# Altium footprint library PCB_MPPT.PcbLib: 48 footprints (part 1 of 3)
Each footprint in its own frame and in the unit in brackets; x right, y up, seen from the top. Pads: shape width x height; smd on the part's side, far side on the other; paste and mask are expansions set on the pad; w line width, h text height; cw(c..) or ccw(c..) is an arc to the next point about the centre after c.
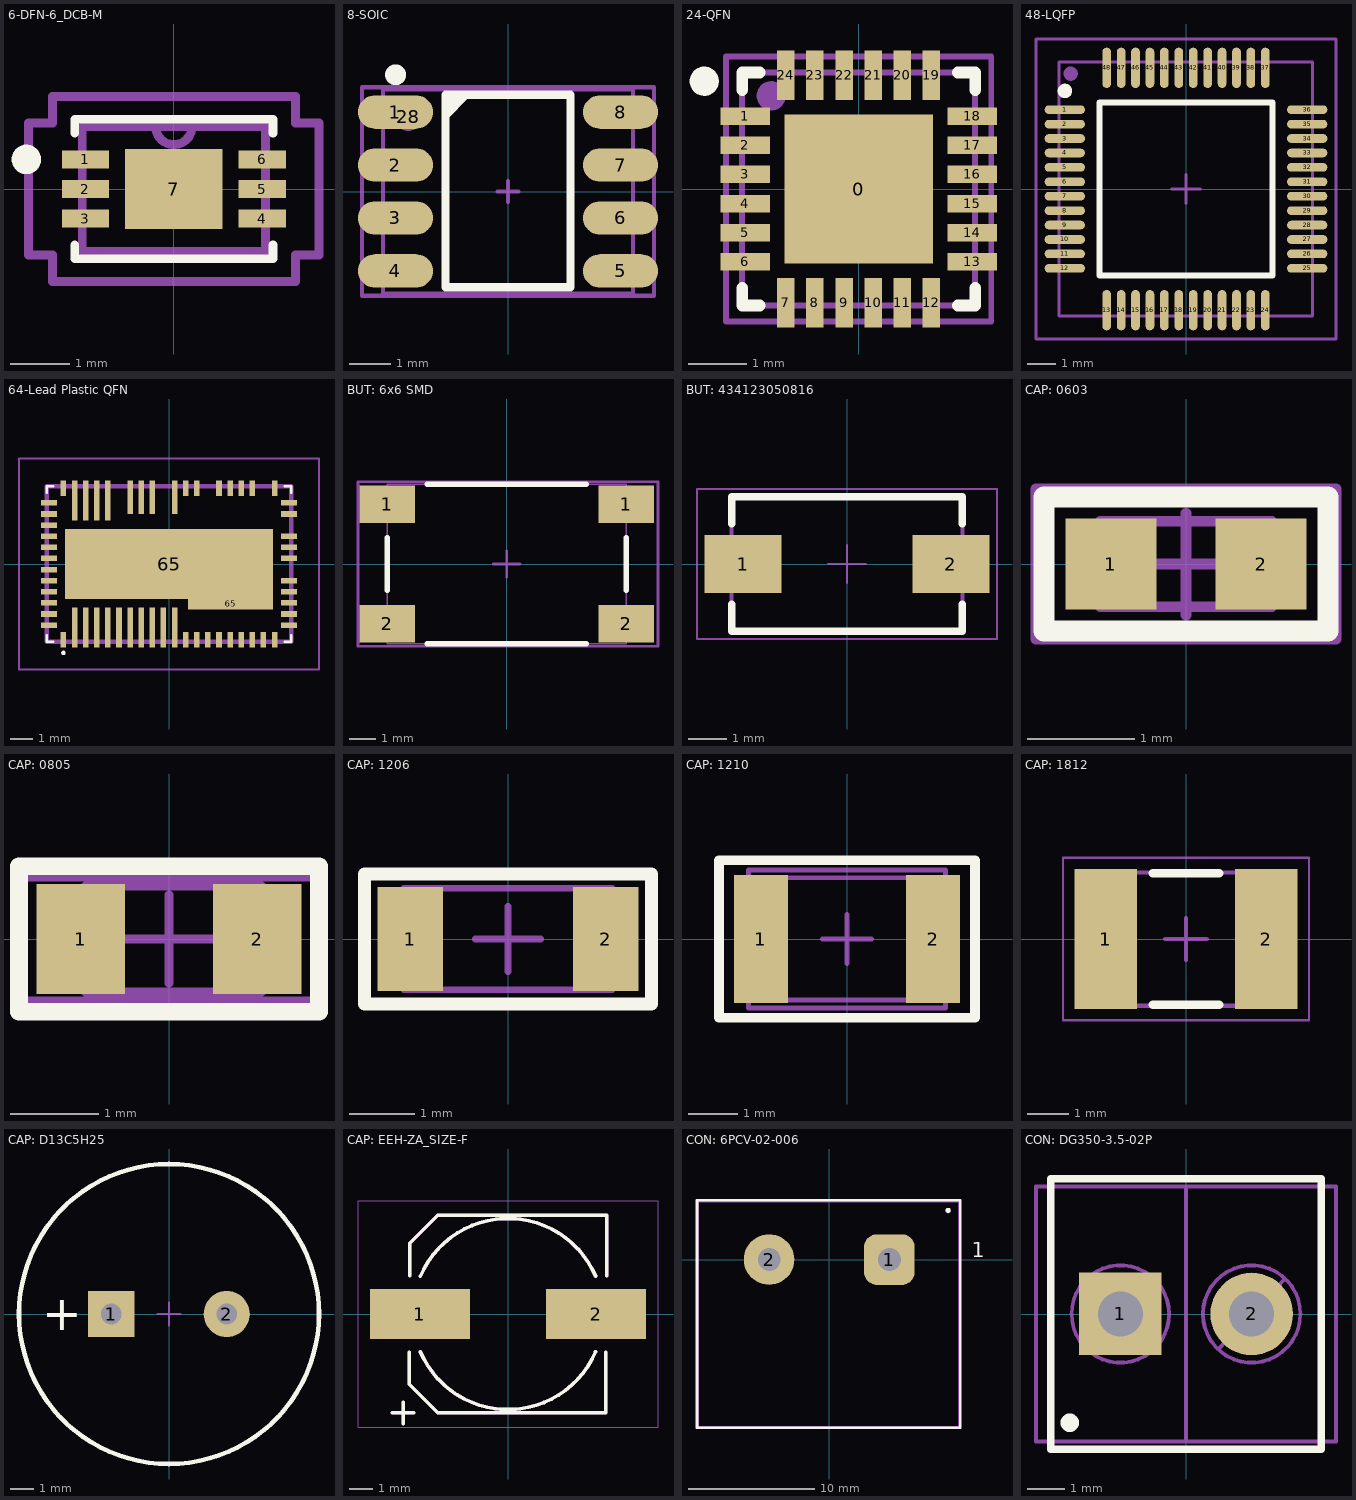
[diagram p0: the footprints below, top view; thin cyan lines are the x and y axes]

## 6-DFN-6_DCB-M [mm]
pads (7):
  rect 0.8x0.3 smd paste+0 mask+0.102: 1(-1.495,0.5)
  rect 0.8x0.3 smd paste+0: 2(-1.495,0) 3(-1.495,-0.5) 4(1.495,-0.5) 5(1.495,0) 6(1.495,0.5)
  rect 1.65x1.35 smd paste-0.864: 7(0,0)
Top Overlay:
  circle w0.25: c-2.495,0.5 r0.125
  lines w0.15: -1.676,-0.945 -1.676,-1.181 1.676,-1.181 1.676,-0.945 ; -1.676,0.945 -1.676,1.181 1.676,1.181 1.676,0.945
Top Paste:
  region: 0.876,0.724 -0.876,0.724 -0.876,-0.724 0.876,-0.724
Top Assy:
  lines w0.15: -0.305,1.054 ccw(c0,1.054) 0.305,1.054 ; -1.549,-1.054 1.549,-1.054 1.549,1.054 -1.549,1.054 -1.549,-1.054
Mechanical 15:
  lines w0.152: -2.457,-1.12 -2.457,1.12 -2.057,1.12 -2.057,1.562 2.057,1.562 2.057,1.12 2.457,1.12 2.457,-1.12 2.057,-1.12 2.057,-1.562 -2.057,-1.562 -2.057,-1.12 -2.457,-1.12
3D body: height 0.25, standoff 0, extent 0,0 0.254,0.254
3D body "DFN-6_DCB-M.step": height 0.81, standoff 0, extent -1.549,-1.054 1.549,1.054

## 8-SOIC [mm] "pitch 1.27 mm"
pads (9):
  rrect100% 1.8x0.8 smd: 1(-2.7,1.905) 2(-2.7,0.635) 3(-2.7,-0.635) 4(-2.7,-1.905) 5(2.7,-1.905) 6(2.7,-0.635) 7(2.7,0.635) 8(2.7,1.905)
  round 0.7 on Mech1: 28(-2.395,1.8)
Top Overlay:
  circle w0.25: c-2.7,2.8 r0.125
  region: -1.56,2.36 -1.56,1.64 -0.84,2.36
  lines w0.2: -1.5,-2.3 1.5,-2.3 1.5,2.325 -1.5,2.325 -1.5,-2.3
Top Assy:
  lines w0.1: -3,-2.45 -3,2.45 3,2.45 3,-2.45 -3,-2.45
Mechanical 15:
  lines w0.1: -0.25,0 0.25,0 ; 0,-0.25 0,0.25 ; -3.5,-2.5 -3.5,2.5 3.5,2.5 3.5,-2.5 -3.5,-2.5
3D body "User Library-SOIC-8-1.STEP": height 1.75, standoff 0, extent -3,-2.45 3,2.45

## 24-QFN [mm] "4x4 mm, pitch 0.5 mm, power pad"
height 0.75
pads (25):
  rect 2.55x2.55 smd: 0(0,0)
  rect 0.85x0.3 smd: 1(-1.95,1.25) 2(-1.95,0.75) 3(-1.95,0.25) 4(-1.95,-0.25) 5(-1.95,-0.75) 6(-1.95,-1.25) 13(1.95,-1.25) 14(1.95,-0.75) 15(1.95,-0.25) 16(1.95,0.25) 17(1.95,0.75) 18(1.95,1.25)
  rect 0.3x0.85 smd: 7(-1.25,-1.95) 8(-0.75,-1.95) 9(-0.25,-1.95) 10(0.25,-1.95) 11(0.75,-1.95) 12(1.25,-1.95) 19(1.25,1.95) 20(0.75,1.95) 21(0.25,1.95) 22(-0.25,1.95) 23(-0.75,1.95) 24(-1.25,1.95)
Top Overlay:
  circle w0.25: c-2.65,1.85 r0.125
  lines w0.2: -2,-1.7 -2,-2 -1.7,-2 ; -2,1.7 -2,2 -1.7,2 ; 1.7,-2 2,-2 2,-1.7 ; 1.7,2 2,2 2,1.7
Top Assy:
  circle w0.25: c-1.5,1.6 r0.125
  lines w0.1: -2,-2 -2,2 2,2 2,-2 -2,-2
Mechanical 15:
  lines w0.1: -0.5,0 0.5,0 ; 0,-0.5 0,0.5 ; -2.275,-2.275 -2.275,2.275 2.275,2.275 2.275,-2.275 -2.275,-2.275
3D body "24-QFN (4x4 mm).step": height 0.75, standoff 0, extent -2,-2 2,2

## 48-LQFP [mm] "QFP, 48-Leads, Body 7x7mm, Pitch 0.5mm, IPC Medium Density"
height 1.6
pads (49):
  oval 1.4x0.3 smd: 1(-4.2,2.75) 2(-4.2,2.25) 3(-4.2,1.75) 4(-4.2,1.25) 5(-4.2,0.75) 6(-4.2,0.25) 7(-4.2,-0.25) 8(-4.2,-0.75) 9(-4.2,-1.25) 10(-4.2,-1.75) 11(-4.2,-2.25) 12(-4.2,-2.75) 25(4.2,-2.75) 26(4.2,-2.25) 27(4.2,-1.75) 28(4.2,-1.25) 29(4.2,-0.75) 30(4.2,-0.25) 31(4.2,0.25) 32(4.2,0.75) 33(4.2,1.25) 34(4.2,1.75) 35(4.2,2.25) 36(4.2,2.75)
  oval 0.3x1.4 smd: 13(-2.75,-4.2) 14(-2.25,-4.2) 15(-1.75,-4.2) 16(-1.25,-4.2) 17(-0.75,-4.2) 18(-0.25,-4.2) 19(0.25,-4.2) 20(0.75,-4.2) 21(1.25,-4.2) 22(1.75,-4.2) 23(2.25,-4.2) 24(2.75,-4.2) 37(2.75,4.2) 38(2.25,4.2) 39(1.75,4.2) 40(1.25,4.2) 41(0.75,4.2) 42(0.25,4.2) 43(-0.25,4.2) 44(-0.75,4.2) 45(-1.25,4.2) 46(-1.75,4.2) 47(-2.25,4.2) 48(-2.75,4.2)
  round 0.5 on Mech1: ""(-4,4)
Top Overlay:
  circle w0.25: c-4.2,3.4 r0.125
  lines w0.2: -3,-3 -3,3 3,3 3,-3 -3,-3
Top Assy:
  lines w0.1: -4.4,-4.4 -4.4,4.4 4.386,4.4 4.386,-4.4 -4.4,-4.4
Mechanical 15:
  lines w0.1: -0.5,0 0.5,0 ; 0,-0.5 0,0.5 ; -5.2,-5.2 -5.2,5.2 5.2,5.2 5.2,-5.2 -5.2,-5.2
3D body "User Library-LQFP48-0_5.STEP": height 1.55, standoff -0.02, extent -4.386,-4.386 4.386,4.386

## 64-Lead Plastic QFN [mm] "64-Lead (7mm ? 11mm) Plastic QFN"
pads (60):
  rect 0.25x0.7 smd: 1(-4.75,-3.4) 12(0.75,-3.4) 13(1.25,-3.4) 14(1.75,-3.4) 15(2.25,-3.4) 16(2.75,-3.4) 17(3.25,-3.4) 18(3.75,-3.4) 19(4.25,-3.4) 20(4.75,-3.4) 33(4.75,3.4) 35(3.75,3.4) 36(3.25,3.4) 37(2.75,3.4) 38(2.25,3.4) 40(1.25,3.4) 41(0.75,3.4) 52(-4.75,3.4)
  rect 0.25x1.8 smd: 2(-4.25,-2.85) 3(-3.75,-2.85) 4(-3.25,-2.85) 5(-2.75,-2.85) 6(-2.25,-2.85) 7(-1.75,-2.85) 8(-1.25,-2.85) 9(-0.75,-2.85) 10(-0.25,-2.85) 11(0.25,-2.85) 48(-2.75,2.85) 49(-3.25,2.85) 50(-3.75,2.85) 51(-4.25,2.85)
  rect 0.7x0.25 smd: 21(5.4,-2.75) 22(5.4,-2.25) 23(5.4,-1.75) 24(5.4,-1.25) 25(5.4,-0.75) 27(5.4,0.25) 28(5.4,0.75) 29(5.4,1.25) 31(5.4,2.25) 32(5.4,2.75) 53(-5.4,2.75) 54(-5.4,2.25) 55(-5.4,1.75) 56(-5.4,1.25) 57(-5.4,0.75) 58(-5.4,0.25) 59(-5.4,-0.25) 60(-5.4,-0.75) 61(-5.4,-1.25) 62(-5.4,-1.75) 63(-5.4,-2.25) 64(-5.4,-2.75)
  rect 0.25x1.5 smd: 42(0.25,3) 44(-0.75,3) 45(-1.25,3) 46(-1.75,3)
  rect 9.38x3.15 smd: 65(0,0)
  rect 3.83x0.5 smd: 65(2.775,-1.8)
Top Overlay:
  lines w0.1: -5.5,-3.2 -5.5,-3.5 -5.2,-3.5 ; -5.5,3.2 -5.5,3.5 -5.2,3.5 ; 5.2,-3.5 5.5,-3.5 5.5,-3.2 ; 5.2,3.5 5.5,3.5 5.5,3.2 ; -4.8,-4 ccw(c-4.75,-4) -4.7,-4 ccw(c-4.75,-4) -4.8,-4
3DBody:
  lines w0.2: -5.5,-3.5 5.5,-3.5 5.5,3.5 -5.5,3.5 -5.5,-3.5
Mechanical 15:
  lines w0.1: -6.75,-4.75 6.75,-4.75 6.75,4.75 -6.75,4.75 -6.75,-4.75
3D body "LT8490IUKJ#PBF.stp": height 0.9, standoff 0, extent -5.5,-3.5 5.5,3.5

## BUT: 6x6 SMD [mm] "Leaded Tactile Button 6x6"
height 9
pads (4):
  rect 2.1x1.4 smd: 1(-4.5,2.25) 1(4.5,2.25) 2(-4.5,-2.25) 2(4.5,-2.25)
Top Overlay:
  lines w0.2: -4.5,-1 -4.5,1 ; -3,-3 3,-3 ; -3,3 3,3 ; 4.5,-1 4.5,1
Top Assy:
  lines w0.05: -4.5,-3 4.5,-3 4.5,3 -4.5,3 -4.5,-3
Mechanical 15:
  lines w0.1: -0.5,0 0.5,0 ; 0,-0.5 0,0.5 ; -5.6,-3.1 -5.6,3.1 5.7,3.1 5.7,-3.1 -5.6,-3.1
3D body "User Library-PTS645SL43SMTR92-LFS.STEP": height 4.3, standoff 0, extent -4.5,-3 4.5,3

## BUT: 434123050816 [mm] "SMD Tact Switch, body 6x3.5mm"
height 5
pads (2):
  rect 2x1.5 smd: 1(-2.7,0) 2(2.7,0)
Top Overlay:
  lines w0.2: -3,-1.05 -3,-1.75 3,-1.75 3,-1.05 ; -3,1.05 -3,1.75 3,1.75 3,1.05
3DBody:
  lines w0.1: -3,-1.75 -3,1.75 3,1.75 3,-1.75 -3,-1.75
Mechanical 15:
  lines w0.05: -0.5,0 0.5,0 ; 0,-0.5 0,0.5 ; -3.9,-1.95 3.9,-1.95 3.9,1.95 -3.9,1.95 -3.9,-1.95
3D body "4341x30508x6.stp": height 5, standoff 0, extent -3.649,-1.75 3.65,1.75

## CAP: 0603 [mm]
height 0.45
pads (2):
  rect 0.85x0.85 smd: 1(-0.7,0) 2(0.7,0)
Top Overlay:
  lines w0.2: -1.325,-0.625 1.325,-0.625 1.325,0.625 -1.325,0.625 -1.325,-0.625
Top Assy:
  lines w0.1: -0.8,-0.4 0.8,-0.4 0.8,0.4 -0.8,0.4 -0.8,-0.4
Mechanical 15:
  lines w0.1: -0.475,0 0.475,0 ; 0,-0.475 0,0.475 ; -1.4,-0.7 -1.4,0.7 1.4,0.7 1.4,-0.7 -1.4,-0.7
3D body "SW3dPS-0603 SMD Capacitor.STEP": height 0.3, standoff 0, extent -0.8,-0.4 0.8,0.4

## CAP: 0805 [mm]
height 0.45
pads (2):
  rect 1x1.25 smd: 1(-1,0) 2(1,0)
Top Overlay:
  lines w0.2: -1.7,-0.825 -1.7,0.825 1.7,0.825 1.7,-0.825 -1.7,-0.825
Top Assy:
  lines w0.1: -0.949,-0.6 -0.949,0.6 1.05,0.6 1.05,-0.6 -0.949,-0.6
Mechanical 15:
  lines w0.1: -0.5,0 0.5,0 ; 0,-0.5 0,0.5 ; -1.7,-0.7 1.7,-0.7 1.7,0.7 -1.7,0.7 -1.7,-0.7
3D body "SW3dPS-0805 SMD Capacitor.STEP": height 0.78, standoff 0, extent -1,-0.625 1,0.625

## CAP: 1206 [mm]
height 0.6
pads (2):
  rect 1x1.6 smd: 1(-1.5,0) 2(1.5,0)
Top Overlay:
  lines w0.2: -2.2,-1 -2.2,1 2.2,1 2.2,-1 -2.2,-1
Top Assy:
  lines w0.1: -1.6,-0.775 -1.6,0.775 1.6,0.775 1.6,-0.775 -1.6,-0.775
Mechanical 15:
  lines w0.1: -0.5,0 0.5,0 ; 0,-0.5 0,0.5 ; -2.2,-1 2.2,-1 2.2,1 -2.2,1 -2.2,-1
3D body "SW3dPS-1206 SMD Capacitor.STEP": height 1, standoff 0, extent -1.6,-0.8 1.6,0.8

## CAP: 1210 [mm]
height 2.5
pads (2):
  rect 1.1x2.6 smd: 1(-1.75,0) 2(1.75,0)
Top Overlay:
  lines w0.2: -2.6,-1.6 2.6,-1.6 2.6,1.6 -2.6,1.6 -2.6,-1.6
Top Assy:
  lines w0.1: -2,-1.244 -2,1.245 2,1.245 2,-1.244 -2,-1.244
Mechanical 15:
  lines w0.1: -0.5,0 0.5,0 ; 0,-0.5 0,0.5 ; -2,-1.4 2,-1.4 2,1.4 -2,1.4 -2,-1.4
3D body "User Library-1210(3225M) Cap.STEP": height 1.7, standoff 0, extent -2,-1.244 2,1.245

## CAP: 1812 [mm]
height 1.4
pads (2):
  rect 1.5x3.35 smd: 1(-1.925,0) 2(1.925,0)
Top Overlay:
  lines w0.2: -0.8,-1.575 0.8,-1.575 ; -0.8,1.575 0.8,1.575
Top Assy:
  lines w0.1: -2.25,-1.6 -2.25,1.6 2.25,1.6 2.25,-1.6 -2.25,-1.6
Mechanical 15:
  lines w0.05: -2.95,-1.95 -2.95,1.95 2.95,1.95 2.95,-1.95 -2.95,-1.95
  lines w0.1: -0.5,0 0.5,0 ; 0,-0.5 0,0.5
3D body "SW3dPS-1812 SMD Capacitor.STEP": height 1.6, standoff 0, extent -2.25,-1.6 2.25,1.6

## CAP: D13C5H25 [mm]
height 25
pads (2):
  rect 2x2 hole 0.9: 1(-2.5,0)
  round 2 hole 0.9: 2(2.5,0)
Top Overlay:
  circle w0.2: c0,0 r6.5
  text "+" at -5.486,-0.695 h1.5
Top Assy:
  circle w0.1: c0,0 r6.5
Mechanical 15:
  circle w0.1: c0,0 r6.5
  lines w0.1: -0.5,0 0.5,0 ; 0,-0.5 0,0.5
3D body "User Library-Cap-EL(13x25-5).STEP": height 25, standoff -3.3, extent -6.5,-6.499 6.502,6.499

## CAP: EEH-ZA_SIZE-F [mm] "SMD=8.3x8.3; D = 8; H= 10.5 Panasonic Hybrid"
pads (2):
  rect 4.2x2.1 smd: 1(-3.7,0) 2(3.7,0)
Top Overlay:
  lines w0.15: -4.85,-4.15 -3.95,-4.15 ; -4.4,-4.6 -4.4,-3.7 ; -4.15,-1.6 -4.15,-2.95 -2.95,-4.15 4.1,-4.15 4.1,-1.6 ; -4.125,1.6 -4.125,2.975 -2.95,4.15 4.15,4.15 4.15,1.6 ; -3.682,-1.577 ccw(c0,-0.014) 3.676,-1.59 ; -3.677,1.59 cw(c0,0.014) 3.682,1.577
Top Assy:
  lines w0.15: -4.85,-4.15 -3.95,-4.15 ; -4.4,-4.6 -4.4,-3.7 ; -4.15,-1.6 -4.15,-2.95 -2.95,-4.15 4.1,-4.15 4.1,-1.6 ; -4.125,1.6 -4.125,2.975 -2.95,4.15 4.15,4.15 4.15,1.6 ; -3.682,-1.577 ccw(c0,-0.014) 3.676,-1.59 ; -3.677,1.59 cw(c0,0.014) 3.682,1.577
Mechanical 15:
  lines w0.05: -6.3,-4.75 6.3,-4.75 6.3,4.75 -6.3,4.75 -6.3,-4.75
3D body "EEH-ZA1J330P.stp": height 10.5, standoff 0, extent -5,-4.25 5,4.25

## CON: 6PCV-02-006 [mm]
pads (2):
  rrect50% 4x4 hole 1.8: 1(4.75,0)
  round 4 hole 1.8: 2(-4.75,0)
Top Overlay:
  circle w0.2: c9.384,3.893 r0.1
  lines w0.2: -10.45,-13.3 -10.45,4.7 10.35,4.7 10.35,-13.3 -10.45,-13.3
  text "1" at 11.252,-0.203 h2
Top Assy:
  circle w0.2: c9.399,3.856 r0.1
  lines w0.1: -10.35,-13.2 -10.35,4.58 10.25,4.58 10.25,-13.2 -10.35,-13.2
  text "1" at 4.45,-3.6 h2
  text "2" at -4.95,-3.6 h2
Mechanical 15:
  lines w0.1: -10.45,-13.3 10.35,-13.3 10.35,4.7 -10.45,4.7 -10.45,-13.3
3D body "02.STEP": height 15.96, standoff -4.99, extent -10.35,-13.2 10.25,4.58

## CON: DG350-3.5-02P [mm]
pads (3):
  rect 2.2x2.2 hole 1.2: 1(-1.75,0)
  round 2.2 hole 1.2: 2(1.75,0)
  round 0.5 on Top Overlay: ""(-3.1,-2.9)
Top Overlay:
  lines w0.2: -3.6,-3.6 3.6,-3.6 3.6,3.6 -3.6,3.6 -3.6,-3.6
Top Assy:
  circle w0.1: c-1.75,0 r1.3
  circle w0.1: c1.75,0 r1.3
  lines w0.1: -2.632,-0.931 -0.868,0.931 ; 0,-3.4 0,3.4 ; 0.868,-0.931 2.632,0.931 ; -4,-3.4 -4,3.4 4,3.4 4,-3.4 -4,-3.4
Mechanical 15:
  lines w0.1: -4,-3.4 -4,3.4 4,3.4 4,-3.4 -4,-3.4
3D body "393570002_molex_terminal.stp": height 8.51, standoff -3.51, extent -3.556,-3.645 3.556,3.645